# Altium integrated library WE_WR-PHD_Pin Header_2.54mm_rev15c.IntLib: 130 symbols (part 1 of 2) (continued)
## WE-2.54 mm Pin Header & Jumper 61003621121 (continued)
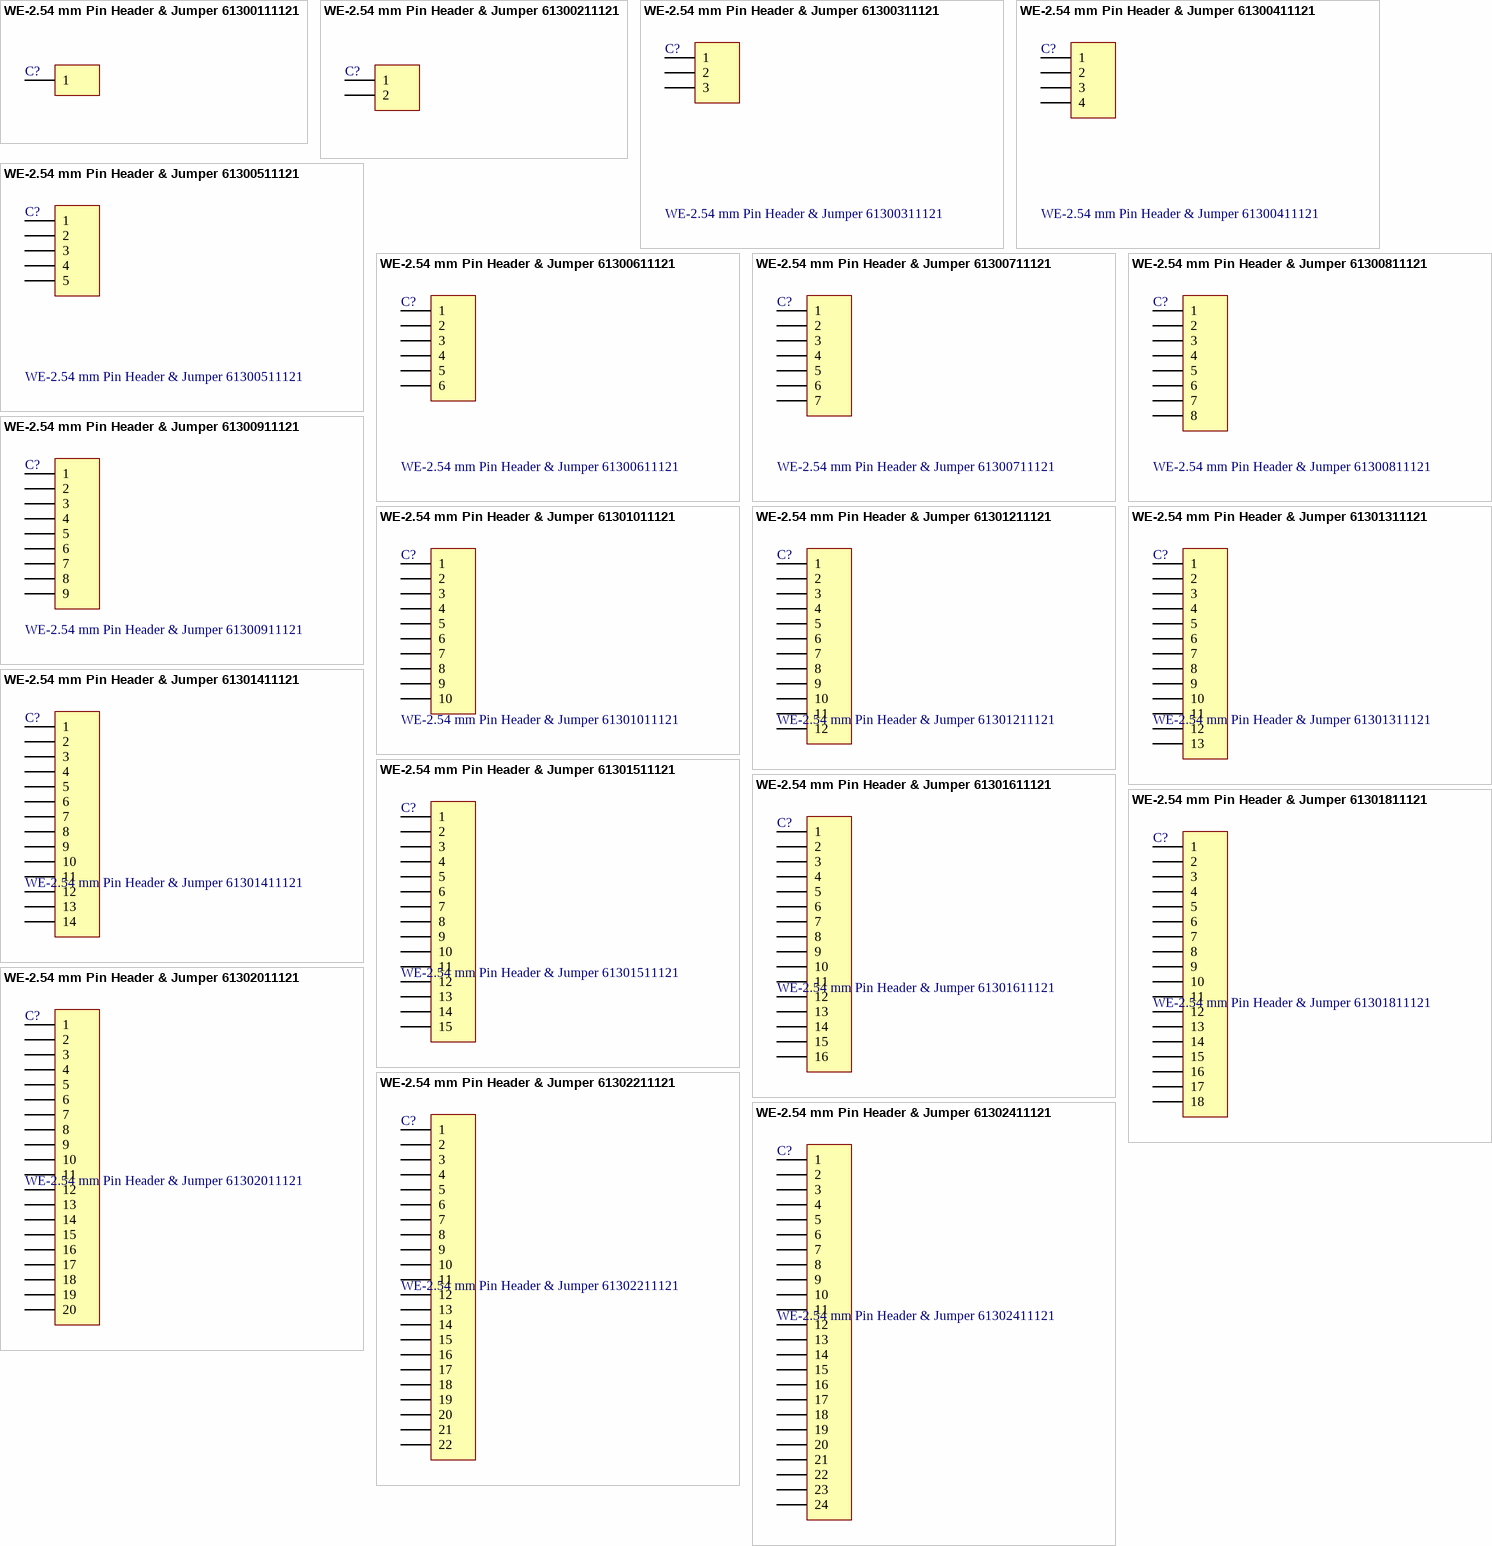
[diagram p3: symbols WE-2.54 mm Pin Header & Jumper 61300111121 to WE-2.54 mm Pin Header & Jumper 61302411121]

## WE-2.54 mm Pin Header & Jumper 61300111121
designator C?
WR-PHD 2.54mm Pin Header; Manufacturer: Würth Elektronik eiSos GmbH; ComponentLink1 Description: Manufacturer; ComponentLink2 Description: Datasheet; NoPins: 01; Created Date: 22 March 2013; partNo: 61300111121; ComponentLink1URL: http://www.we-online.com; ComponentLink2URL: http://katalog.we-online.de/em/datasheet/6130xx11121.pdf; Created by: Karrer Zheng
footprint 61300111121 (1pins, 1 row, straight, gold plating)
pins: 1

## WE-2.54 mm Pin Header & Jumper 61300211121
designator C?
WR-PHD 2.54mm Pin Header; Manufacturer: Würth Elektronik eiSos GmbH; ComponentLink1 Description: Manufacturer; ComponentLink2 Description: Datasheet; NoPins: 02; Created Date: 22 March 2013; partNo: 61300211121; ComponentLink1URL: http://www.we-online.com; ComponentLink2URL: http://katalog.we-online.de/em/datasheet/6130xx11121.pdf; Created by: Karrer Zheng
footprint 61300211121 (2 pins, 1 row, straight, gold plating)
pins: 1, 2

## WE-2.54 mm Pin Header & Jumper 61300311121
designator C?
WR-PHD 2.54mm Pin Header; Manufacturer: Würth Elektronik eiSos GmbH; ComponentLink1 Description: Manufacturer; ComponentLink2 Description: Datasheet; NoPins: 03; Created Date: 22 March 2013; partNo: 61300311121; ComponentLink1URL: http://www.we-online.com; ComponentLink2URL: http://katalog.we-online.de/em/datasheet/6130xx11121.pdf; Created by: Karrer Zheng
footprint 61300311121 (3 pins, 1 row, straight, gold plating)
pins: 1, 2, 3

## WE-2.54 mm Pin Header & Jumper 61300411121
designator C?
WR-PHD 2.54mm Pin Header; Manufacturer: Würth Elektronik eiSos GmbH; ComponentLink1 Description: Manufacturer; ComponentLink2 Description: Datasheet; NoPins: 04; Created Date: 22 March 2013; partNo: 61300411121; ComponentLink1URL: http://www.we-online.com; ComponentLink2URL: http://katalog.we-online.de/em/datasheet/6130xx11121.pdf; Created by: Karrer Zheng
footprint 61300411121 (4 pins, 1 row, straight, gold plating)
pins: 1, 2, 3, 4

## WE-2.54 mm Pin Header & Jumper 61300511121
designator C?
WR-PHD 2.54mm Pin Header; Manufacturer: Würth Elektronik eiSos GmbH; ComponentLink1 Description: Manufacturer; ComponentLink2 Description: Datasheet; NoPins: 05; Created Date: 22 March 2013; partNo: 61300511121; ComponentLink1URL: http://www.we-online.com; ComponentLink2URL: http://katalog.we-online.de/em/datasheet/6130xx11121.pdf; Created by: Karrer Zheng
footprint 61300511121 (5 pins, 1 row, straight, gold plating)
pins: 1, 2, 3, 4, 5

## WE-2.54 mm Pin Header & Jumper 61300611121
designator C?
WR-PHD 2.54mm Pin Header; Manufacturer: Würth Elektronik eiSos GmbH; ComponentLink1 Description: Manufacturer; ComponentLink2 Description: Datasheet; NoPins: 06; Created Date: 22 March 2013; partNo: 61300611121; ComponentLink1URL: http://www.we-online.com; ComponentLink2URL: http://katalog.we-online.de/em/datasheet/6130xx11121.pdf; Created by: Karrer Zheng
footprint 61300611121 (6 pins, 1 row, straight, gold plating)
pins: 1, 2, 3, 4, 5, 6

## WE-2.54 mm Pin Header & Jumper 61300711121
designator C?
WR-PHD 2.54mm Pin Header; Manufacturer: Würth Elektronik eiSos GmbH; ComponentLink1 Description: Manufacturer; ComponentLink2 Description: Datasheet; NoPins: 07; Created Date: 22 March 2013; partNo: 61300711121; ComponentLink1URL: http://www.we-online.com; ComponentLink2URL: http://katalog.we-online.de/em/datasheet/6130xx11121.pdf; Created by: Karrer Zheng
footprint 61300711121 (7 pins, 1 row, straight, gold plating)
pins: 1, 2, 3, 4, 5, 6, 7

## WE-2.54 mm Pin Header & Jumper 61300811121
designator C?
WR-PHD 2.54mm Pin Header; Manufacturer: Würth Elektronik eiSos GmbH; ComponentLink1 Description: Manufacturer; ComponentLink2 Description: Datasheet; NoPins: 08; Created Date: 22 March 2013; partNo: 61300811121; ComponentLink1URL: http://www.we-online.com; ComponentLink2URL: http://katalog.we-online.de/em/datasheet/6130xx11121.pdf; Created by: Karrer Zheng
footprint 61300811121 (8 pins, 1 row, straight, gold plating)
pins: 1, 2, 3, 4, 5, 6, 7, 8

## WE-2.54 mm Pin Header & Jumper 61300911121
designator C?
WR-PHD 2.54mm Pin Header; Manufacturer: Würth Elektronik eiSos GmbH; ComponentLink1 Description: Manufacturer; ComponentLink2 Description: Datasheet; NoPins: 09; Created Date: 22 March 2013; partNo: 61300911121; ComponentLink1URL: http://www.we-online.com; ComponentLink2URL: http://katalog.we-online.de/em/datasheet/6130xx11121.pdf; Created by: Karrer Zheng
footprint 61300911121 (9 pins, 1 row, straight, gold plating)
pins: 1, 2, 3, 4, 5, 6, 7, 8, 9

## WE-2.54 mm Pin Header & Jumper 61301011121
designator C?
WR-PHD 2.54mm Pin Header; Manufacturer: Würth Elektronik eiSos GmbH; ComponentLink1 Description: Manufacturer; ComponentLink2 Description: Datasheet; NoPins: 10; Created Date: 22 March 2013; partNo: 61301011121; ComponentLink1URL: http://www.we-online.com; ComponentLink2URL: http://katalog.we-online.de/em/datasheet/6130xx11121.pdf; Created by: Karrer Zheng
footprint 61301011121 (10 pins, 1 row, straight, gold plating)
pins: 1, 2, 3, 4, 5, 6, 7, 8, 9, 10

## WE-2.54 mm Pin Header & Jumper 61301211121
designator C?
WR-PHD 2.54mm Pin Header; Manufacturer: Würth Elektronik eiSos GmbH; ComponentLink1 Description: Manufacturer; ComponentLink2 Description: Datasheet; NoPins: 12; Created Date: 22 March 2013; partNo: 61301211121; ComponentLink1URL: http://www.we-online.com; ComponentLink2URL: http://katalog.we-online.de/em/datasheet/6130xx11121.pdf; Created by: Karrer Zheng
footprint 61301211121 (12 pins, 1 row, straight, gold plating)
pins: 1, 2, 3, 4, 5, 6, 7, 8, 9, 10, 11, 12

## WE-2.54 mm Pin Header & Jumper 61301311121
designator C?
WR-PHD 2.54mm Pin Header; Manufacturer: Würth Elektronik eiSos GmbH; ComponentLink1 Description: Manufacturer; ComponentLink2 Description: Datasheet; NoPins: 13; Created Date: 22 March 2013; partNo: 61301311121; ComponentLink1URL: http://www.we-online.com; ComponentLink2URL: http://katalog.we-online.de/em/datasheet/6130xx11121.pdf; Created by: Karrer Zheng
footprint 61301311121 (13 pins, 1 row, straight, gold plating)
pins: 1, 2, 3, 4, 5, 6, 7, 8, 9, 10, 11, 12, 13

## WE-2.54 mm Pin Header & Jumper 61301411121
designator C?
WR-PHD 2.54mm Pin Header; Manufacturer: Würth Elektronik eiSos GmbH; ComponentLink1 Description: Manufacturer; ComponentLink2 Description: Datasheet; NoPins: 14; Created Date: 22 March 2013; partNo: 61301411121; ComponentLink1URL: http://www.we-online.com; ComponentLink2URL: http://katalog.we-online.de/em/datasheet/6130xx11121.pdf; Created by: Karrer Zheng
footprint 61301411121 (14 pins, 1 row, straight, gold plating)
pins: 1, 2, 3, 4, 5, 6, 7, 8, 9, 10, 11, 12, 13, 14

## WE-2.54 mm Pin Header & Jumper 61301511121
designator C?
WR-PHD 2.54mm Pin Header; Manufacturer: Würth Elektronik eiSos GmbH; ComponentLink1 Description: Manufacturer; ComponentLink2 Description: Datasheet; NoPins: 01; Created Date: 22 March 2013; partNo: 61301511121; ComponentLink1URL: http://www.we-online.com; ComponentLink2URL: http://katalog.we-online.de/em/datasheet/6130xx11121.pdf; Created by: Karrer Zheng
footprint 61301511121 (15  pins, 1 row, straight, gold plating)
pins: 1, 2, 3, 4, 5, 6, 7, 8, 9, 10, 11, 12, 13, 14, 15

## WE-2.54 mm Pin Header & Jumper 61301611121
designator C?
WR-PHD 2.54mm Pin Header; Manufacturer: Würth Elektronik eiSos GmbH; ComponentLink1 Description: Manufacturer; ComponentLink2 Description: Datasheet; NoPins: 16; Created Date: 22 March 2013; partNo: 61301611121; ComponentLink1URL: http://www.we-online.com; ComponentLink2URL: http://katalog.we-online.de/em/datasheet/6130xx11121.pdf; Created by: Karrer Zheng
footprint 61301611121 (16  pins, 1 row, straight, gold plating)
pins: 1, 2, 3, 4, 5, 6, 7, 8, 9, 10, 11, 12, 13, 14, 15, 16

## WE-2.54 mm Pin Header & Jumper 61301811121
designator C?
WR-PHD 2.54mm Pin Header; Manufacturer: Würth Elektronik eiSos GmbH; ComponentLink1 Description: Manufacturer; ComponentLink2 Description: Datasheet; NoPins: 18; Created Date: 22 March 2013; partNo: 61301811121; ComponentLink1URL: http://www.we-online.com; ComponentLink2URL: http://katalog.we-online.de/em/datasheet/6130xx11121.pdf; Created by: Karrer Zheng
footprint 61301811121 (18 pins, 1 row, straight, gold plating)
pins: 1, 2, 3, 4, 5, 6, 7, 8, 9, 10, 11, 12, 13, 14, 15, 16, 17, 18

## WE-2.54 mm Pin Header & Jumper 61302011121
designator C?
WR-PHD 2.54mm Pin Header; Manufacturer: Würth Elektronik eiSos GmbH; ComponentLink1 Description: Manufacturer; ComponentLink2 Description: Datasheet; NoPins: 20; Created Date: 22 March 2013; partNo: 61302011121; ComponentLink1URL: http://www.we-online.com; ComponentLink2URL: http://katalog.we-online.de/em/datasheet/6130xx11121.pdf; Created by: Karrer Zheng
footprint 61302011121 (20 pins, 1 row, straight, gold plating)
pins: 1, 2, 3, 4, 5, 6, 7, 8, 9, 10, 11, 12, 13, 14, 15, 16, 17, 18, 19, 20

## WE-2.54 mm Pin Header & Jumper 61302211121
designator C?
WR-PHD 2.54mm Pin Header; Manufacturer: Würth Elektronik eiSos GmbH; ComponentLink1 Description: Manufacturer; ComponentLink2 Description: Datasheet; NoPins: 22; Created Date: 22 March 2013; partNo: 61302211121; ComponentLink1URL: http://www.we-online.com; ComponentLink2URL: http://katalog.we-online.de/em/datasheet/6130xx11121.pdf; Created by: Karrer Zheng
footprint 61302211121 (22 pins, 1 row, straight, gold plating)
pins: 1, 2, 3, 4, 5, 6, 7, 8, 9, 10, 11, 12, 13, 14, 15, 16, 17, 18, 19, 20, 21, 22

## WE-2.54 mm Pin Header & Jumper 61302411121
designator C?
WR-PHD 2.54mm Pin Header; Manufacturer: Würth Elektronik eiSos GmbH; ComponentLink1 Description: Manufacturer; ComponentLink2 Description: Datasheet; NoPins: 24; Created Date: 22 March 2013; partNo: 61302411121; ComponentLink1URL: http://www.we-online.com; ComponentLink2URL: http://katalog.we-online.de/em/datasheet/6130xx11121.pdf; Created by: Karrer Zheng
footprint 61302411121 (24 pins, 1 row, straight, gold plating)
pins: 1, 2, 3, 4, 5, 6, 7, 8, 9, 10, 11, 12, 13, 14, 15, 16, 17, 18, 19, 20, 21, 22, 23, 24

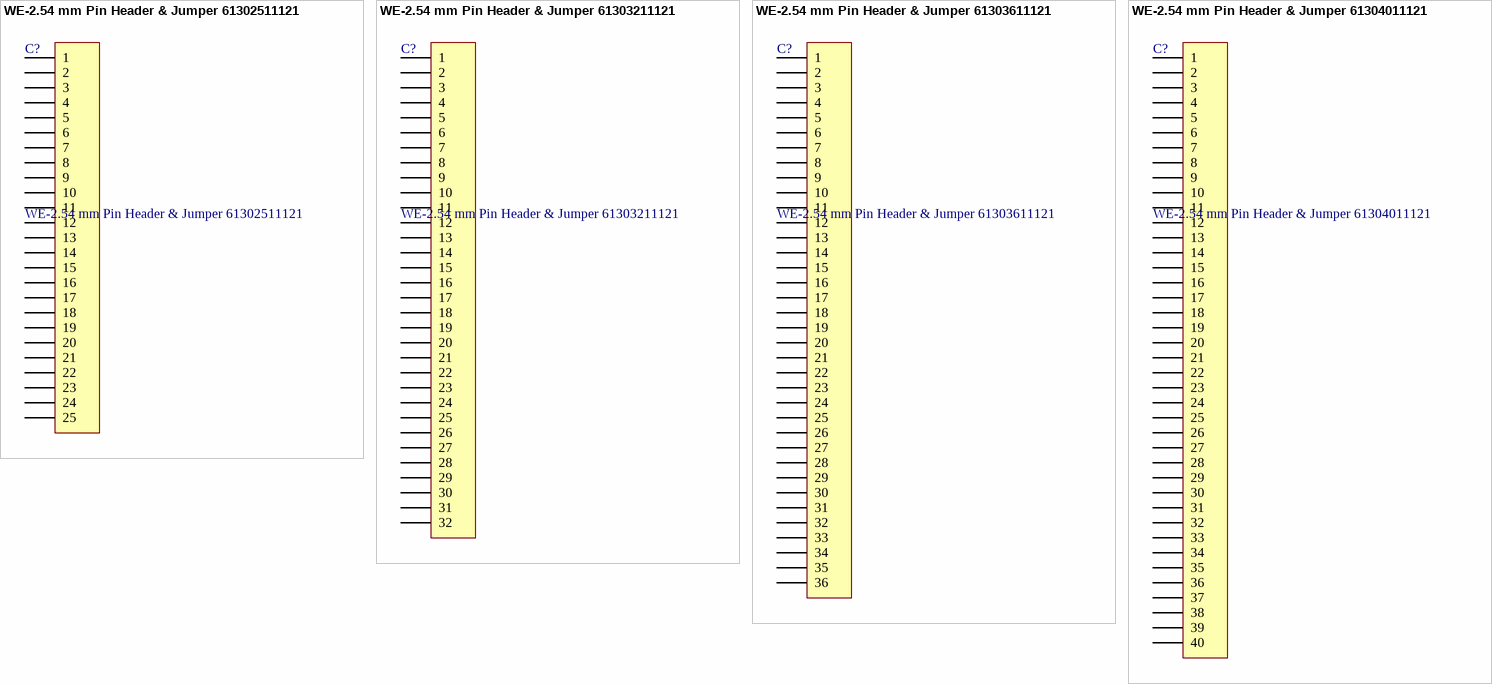
[diagram p4: symbols WE-2.54 mm Pin Header & Jumper 61302511121 to WE-2.54 mm Pin Header & Jumper 61304011121]

## WE-2.54 mm Pin Header & Jumper 61302511121
designator C?
WR-PHD 2.54mm Pin Header; Manufacturer: Würth Elektronik eiSos GmbH; ComponentLink1 Description: Manufacturer; ComponentLink2 Description: Datasheet; NoPins: 25; Created Date: 22 March 2013; partNo: 61302511121; ComponentLink1URL: http://www.we-online.com; ComponentLink2URL: http://katalog.we-online.de/em/datasheet/6130xx11121.pdf; Created by: Karrer Zheng
footprint 61302511121 (25 pins, 1 row, straight, gold plating)
pins: 1, 2, 3, 4, 5, 6, 7, 8, 9, 10, 11, 12, 13, 14, 15, 16, 17, 18, 19, 20, 21, 22, 23, 24, 25

## WE-2.54 mm Pin Header & Jumper 61303211121
designator C?
WR-PHD 2.54mm Pin Header; Manufacturer: Würth Elektronik eiSos GmbH; ComponentLink1 Description: Manufacturer; ComponentLink2 Description: Datasheet; NoPins: 32; Created Date: 22 March 2013; partNo: 61303211121; ComponentLink1URL: http://www.we-online.com; ComponentLink2URL: http://katalog.we-online.de/em/datasheet/6130xx11121.pdf; Created by: Karrer Zheng
footprint 61303211121 (32 pins, 1 row, straight, gold plating)
pins: 1, 2, 3, 4, 5, 6, 7, 8, 9, 10, 11, 12, 13, 14, 15, 16, 17, 18, 19, 20, 21, 22, 23, 24, 25, 26, 27, 28, 29, 30, 31, 32

## WE-2.54 mm Pin Header & Jumper 61303611121
designator C?
WR-PHD 2.54mm Pin Header; Manufacturer: Würth Elektronik eiSos GmbH; ComponentLink1 Description: Manufacturer; ComponentLink2 Description: Datasheet; NoPins: 36; Created Date: 22 March 2013; partNo: 61303611121; ComponentLink1URL: http://www.we-online.com; ComponentLink2URL: http://katalog.we-online.de/em/datasheet/6130xx11121.pdf; Created by: Karrer Zheng
footprint 61303611121 (36 pins, 1 row, straight, gold plating)
pins: 1, 2, 3, 4, 5, 6, 7, 8, 9, 10, 11, 12, 13, 14, 15, 16, 17, 18, 19, 20, 21, 22, 23, 24, 25, 26, 27, 28, 29, 30, 31, 32, 33, 34, 35, 36

## WE-2.54 mm Pin Header & Jumper 61304011121
designator C?
WR-PHD 2.54mm Pin Header; Manufacturer: Würth Elektronik eiSos GmbH; ComponentLink1 Description: Manufacturer; ComponentLink2 Description: Datasheet; NoPins: 40; Created Date: 22 March 2013; partNo: 61304011121; ComponentLink1URL: http://www.we-online.com; ComponentLink2URL: http://katalog.we-online.de/em/datasheet/6130xx11121.pdf; Created by: Karrer Zheng
footprint 61304011121 (40 pins, 1 row, straight, gold plating)
pins: 1, 2, 3, 4, 5, 6, 7, 8, 9, 10, 11, 12, 13, 14, 15, 16, 17, 18, 19, 20, 21, 22, 23, 24, 25, 26, 27, 28, 29, 30, 31, 32, 33, 34, 35, 36, 37, 38, 39, 40


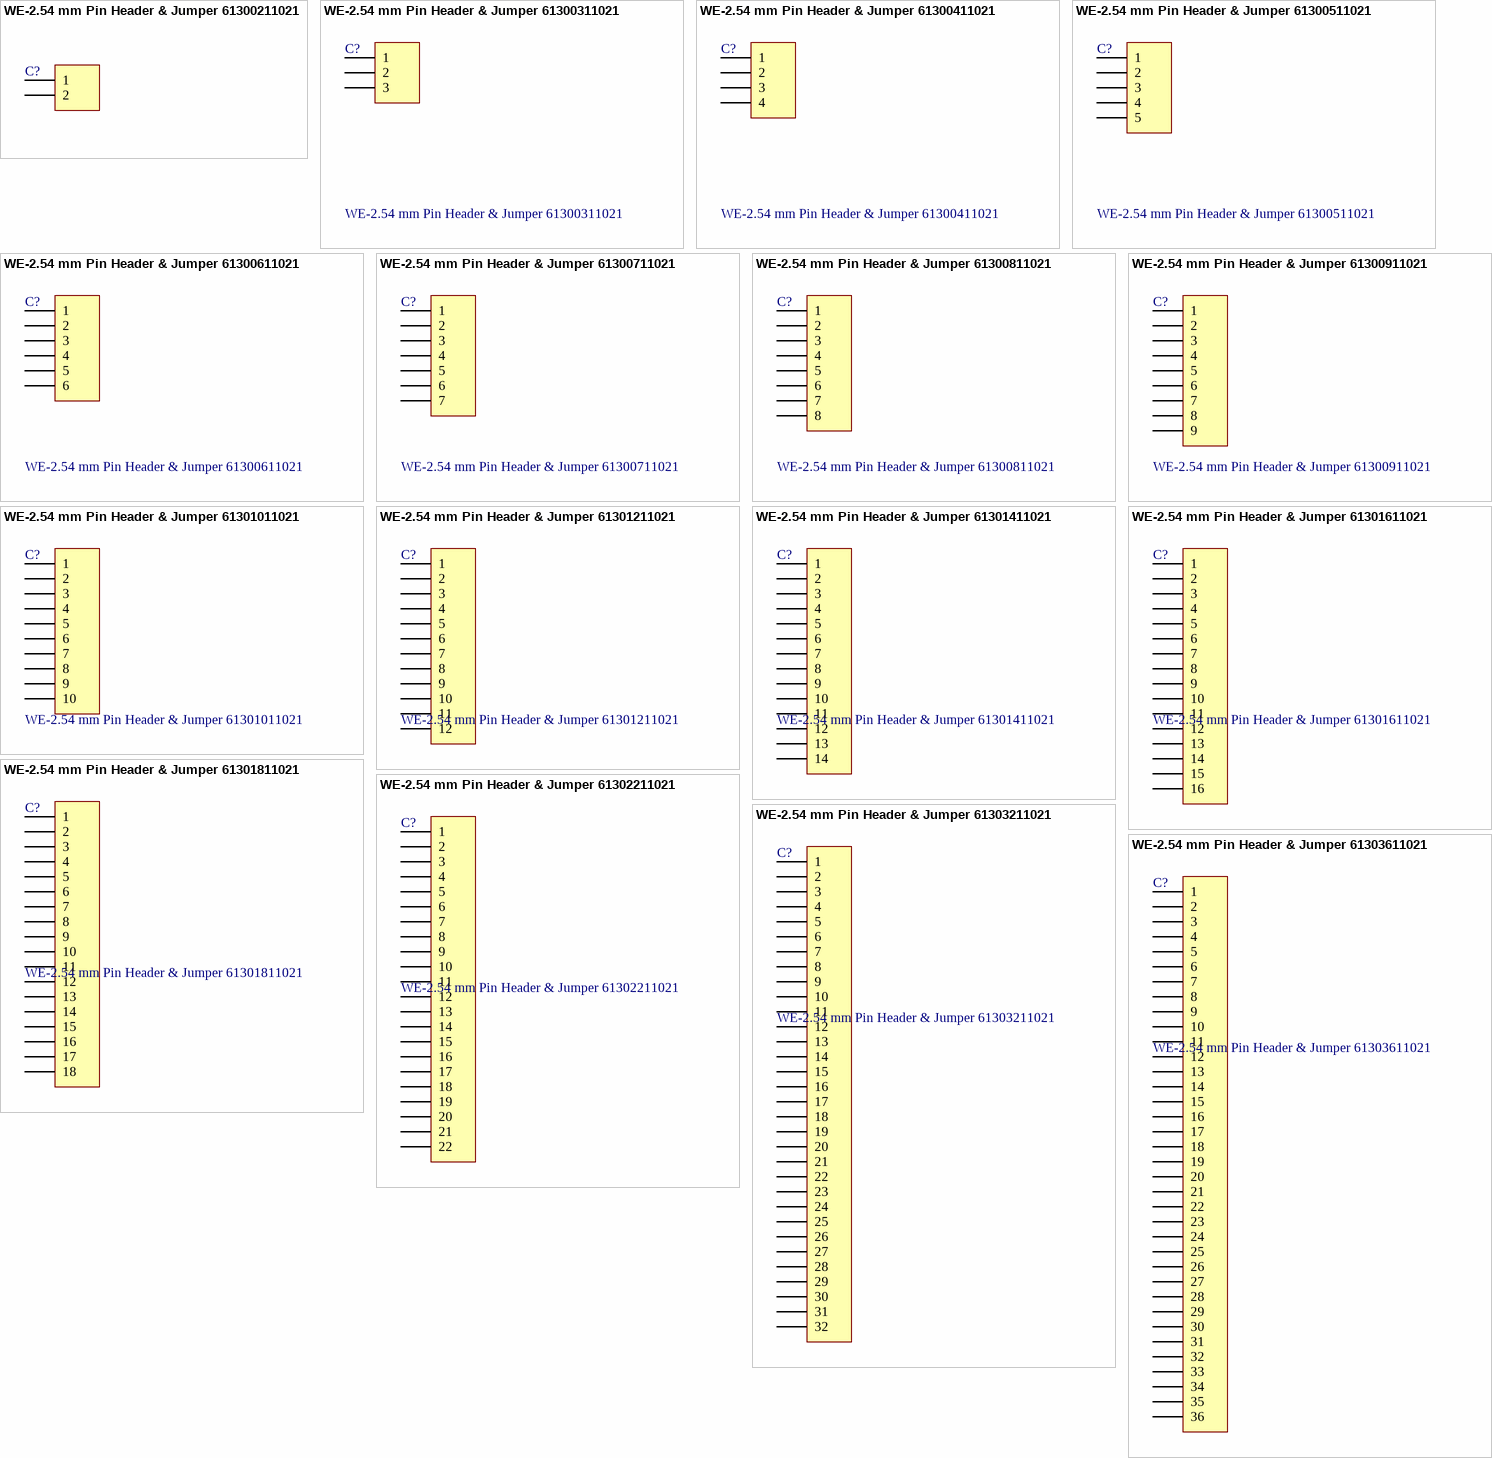
[diagram p5: symbols WE-2.54 mm Pin Header & Jumper 61300211021 to WE-2.54 mm Pin Header & Jumper 61303611021]

## WE-2.54 mm Pin Header & Jumper 61300211021
designator C?
WR-PHD 2.54mm Angled Pin Header; Manufacturer: Würth Elektronik eiSos GmbH; ComponentLink1 Description: Manufacturer; ComponentLink2 Description: Datasheet; NoPins: 02; Created Date: 25 March 2013; partNo: 61300211021; ComponentLink1URL: http://www.we-online.com; ComponentLink2URL: http://katalog.we-online.de/em/datasheet/6130xx11021.pdf; Created by: Karrer Zheng
footprint 61300211021 (2 pins, 1 row, right angled, gold plating)
pins: 1, 2

## WE-2.54 mm Pin Header & Jumper 61300311021
designator C?
WR-PHD 2.54mm Angled Pin Header; Manufacturer: Würth Elektronik eiSos GmbH; ComponentLink1 Description: Manufacturer; ComponentLink2 Description: Datasheet; NoPins: 03; Created Date: 25 March 2013; partNo: 61300311021; ComponentLink1URL: http://www.we-online.com; ComponentLink2URL: http://katalog.we-online.de/em/datasheet/6130xx11021.pdf; Created by: Karrer Zheng
footprint 61300311021 (3 pins, 1 row, right angled, gold plating)
pins: 1, 2, 3

## WE-2.54 mm Pin Header & Jumper 61300411021
designator C?
WR-PHD 2.54mm Angled Pin Header; Manufacturer: Würth Elektronik eiSos GmbH; ComponentLink1 Description: Manufacturer; ComponentLink2 Description: Datasheet; NoPins: 04; Created Date: 25 March 2013; partNo: 61300411021; ComponentLink1URL: http://www.we-online.com; ComponentLink2URL: http://katalog.we-online.de/em/datasheet/6130xx11021.pdf; Created by: Karrer Zheng
footprint 61300411021 (4 pins, 1 row, right angled, gold plating)
pins: 1, 2, 3, 4

## WE-2.54 mm Pin Header & Jumper 61300511021
designator C?
WR-PHD 2.54mm Angled Pin Header; Manufacturer: Würth Elektronik eiSos GmbH; ComponentLink1 Description: Manufacturer; ComponentLink2 Description: Datasheet; NoPins: 05; Created Date: 25 March 2013; partNo: 61300511021; ComponentLink1URL: http://www.we-online.com; ComponentLink2URL: http://katalog.we-online.de/em/datasheet/6130xx11021.pdf; Created by: Karrer Zheng
footprint 61300511021 (5 pins, 1 row, right angled, gold plating)
pins: 1, 2, 3, 4, 5

## WE-2.54 mm Pin Header & Jumper 61300611021
designator C?
WR-PHD 2.54mm Angled Pin Header; Manufacturer: Würth Elektronik eiSos GmbH; ComponentLink1 Description: Manufacturer; ComponentLink2 Description: Datasheet; NoPins: 06; Created Date: 25 March 2013; partNo: 61300611021; ComponentLink1URL: http://www.we-online.com; ComponentLink2URL: http://katalog.we-online.de/em/datasheet/6130xx11021.pdf; Created by: Karrer Zheng
footprint 61300611021 (6 pins, 1 row, right angled, gold plating)
pins: 1, 2, 3, 4, 5, 6

## WE-2.54 mm Pin Header & Jumper 61300711021
designator C?
WR-PHD 2.54mm Angled Pin Header; Manufacturer: Würth Elektronik eiSos GmbH; ComponentLink1 Description: Manufacturer; ComponentLink2 Description: Datasheet; NoPins: 07; Created Date: 25 March 2013; partNo: 61300711021; ComponentLink1URL: http://www.we-online.com; ComponentLink2URL: http://katalog.we-online.de/em/datasheet/6130xx11021.pdf; Created by: Karrer Zheng
footprint 61300711021 (7 pins, 1 row, right angled, gold plating)
pins: 1, 2, 3, 4, 5, 6, 7

## WE-2.54 mm Pin Header & Jumper 61300811021
designator C?
WR-PHD 2.54mm Angled Pin Header; Manufacturer: Würth Elektronik eiSos Gmb; ComponentLink1 Description: Manufacturer; ComponentLink2 Description: Datasheet; NoPins: 08; Created Date: 25 March 2013; partNo: 61300811021; ComponentLink1URL: http://www.we-online.com; ComponentLink2URL: http://katalog.we-online.de/em/datasheet/6130xx11021.pdf; Created by: Karrer Zheng
footprint 61300811021 (8 pins, 1 row, right angled, gold plating)
pins: 1, 2, 3, 4, 5, 6, 7, 8
